# Altium footprint library ref-packages.PCBLIB: 1543 footprints (part 74 of 103) (continued)
## SQFP-R-28X40-432 [mm] (continued)
  rect 1.6x0.17 smd: 129(20.6,-13.05) 130(20.6,-12.75) 131(20.6,-12.45) 132(20.6,-12.15) 133(20.6,-11.85) 134(20.6,-11.55) 135(20.6,-11.25) 136(20.6,-10.95) 137(20.6,-10.65) 138(20.6,-10.35) 139(20.6,-10.05) 140(20.6,-9.75) 141(20.6,-9.45) 142(20.6,-9.15) 143(20.6,-8.85) 144(20.6,-8.55) 145(20.6,-8.25) 146(20.6,-7.95) 147(20.6,-7.65) 148(20.6,-7.35) 149(20.6,-7.05) 150(20.6,-6.75) 151(20.6,-6.45) 152(20.6,-6.15) 153(20.6,-5.85) 154(20.6,-5.55) 155(20.6,-5.25) 156(20.6,-4.95) 157(20.6,-4.65) 158(20.6,-4.35) 159(20.6,-4.05) 160(20.6,-3.75) 161(20.6,-3.45) 162(20.6,-3.15) 163(20.6,-2.85) 164(20.6,-2.55) 165(20.6,-2.25) 166(20.6,-1.95) 167(20.6,-1.65) 168(20.6,-1.35) 169(20.6,-1.05) 170(20.6,-0.75) 171(20.6,-0.45) 172(20.6,-0.15) 173(20.6,0.15) 174(20.6,0.45) 175(20.6,0.75) 176(20.6,1.05) 177(20.6,1.35) 178(20.6,1.65) 179(20.6,1.95) 180(20.6,2.25) 181(20.6,2.55) 182(20.6,2.85) 183(20.6,3.15) 184(20.6,3.45) 185(20.6,3.75) 186(20.6,4.05) 187(20.6,4.35) 188(20.6,4.65) 189(20.6,4.95) 190(20.6,5.25) 191(20.6,5.55) 192(20.6,5.85) 193(20.6,6.15) 194(20.6,6.45) 195(20.6,6.75) 196(20.6,7.05) 197(20.6,7.35) 198(20.6,7.65) 199(20.6,7.95) 200(20.6,8.25) 201(20.6,8.55) 202(20.6,8.85) 203(20.6,9.15) 204(20.6,9.45) 205(20.6,9.75) 206(20.6,10.05) 207(20.6,10.35) 208(20.6,10.65) 209(20.6,10.95) 210(20.6,11.25) 211(20.6,11.55) 212(20.6,11.85) 213(20.6,12.15) 214(20.6,12.45) 215(20.6,12.75) 216(20.6,13.05) 345(-20.6,13.05) 346(-20.6,12.75) 347(-20.6,12.45) 348(-20.6,12.15) 349(-20.6,11.85) 350(-20.6,11.55) 351(-20.6,11.25) 352(-20.6,10.95) 353(-20.6,10.65) 354(-20.6,10.35) 355(-20.6,10.05) 356(-20.6,9.75) 357(-20.6,9.45) 358(-20.6,9.15) 359(-20.6,8.85) 360(-20.6,8.55) 361(-20.6,8.25) 362(-20.6,7.95) 363(-20.6,7.65) 364(-20.6,7.35) 365(-20.6,7.05) 366(-20.6,6.75) 367(-20.6,6.45) 368(-20.6,6.15) 369(-20.6,5.85) 370(-20.6,5.55) 371(-20.6,5.25) 372(-20.6,4.95) 373(-20.6,4.65) 374(-20.6,4.35) 375(-20.6,4.05) 376(-20.6,3.75) 377(-20.6,3.45) 378(-20.6,3.15) 379(-20.6,2.85) 380(-20.6,2.55) 381(-20.6,2.25) 382(-20.6,1.95) 383(-20.6,1.65) 384(-20.6,1.35) 385(-20.6,1.05) 386(-20.6,0.75) 387(-20.6,0.45) 388(-20.6,0.15) 389(-20.6,-0.15) 390(-20.6,-0.45) 391(-20.6,-0.75) 392(-20.6,-1.05) 393(-20.6,-1.35) 394(-20.6,-1.65) 395(-20.6,-1.95) 396(-20.6,-2.25) 397(-20.6,-2.55) 398(-20.6,-2.85) 399(-20.6,-3.15) 400(-20.6,-3.45) 401(-20.6,-3.75) 402(-20.6,-4.05) 403(-20.6,-4.35) 404(-20.6,-4.65) 405(-20.6,-4.95) 406(-20.6,-5.25) 407(-20.6,-5.55) 408(-20.6,-5.85) 409(-20.6,-6.15) 410(-20.6,-6.45) 411(-20.6,-6.75) 412(-20.6,-7.05) 413(-20.6,-7.35) 414(-20.6,-7.65) 415(-20.6,-7.95) 416(-20.6,-8.25) 417(-20.6,-8.55) 418(-20.6,-8.85) 419(-20.6,-9.15) 420(-20.6,-9.45) 421(-20.6,-9.75) 422(-20.6,-10.05) 423(-20.6,-10.35) 424(-20.6,-10.65) 425(-20.6,-10.95) 426(-20.6,-11.25) 427(-20.6,-11.55) 428(-20.6,-11.85) 429(-20.6,-12.15) 430(-20.6,-12.45) 431(-20.6,-12.75) 432(-20.6,-13.05)
Top Overlay:
  circle w0.254: c-17.75,-12 r0.75
  lines w0.203: -19.57,-13.56 19.56,-13.56 19.56,13.56 -19.57,13.56 -19.57,-13.56
Mechanical 16:
  drawing of 436 lines, arcs and shapes, not listed
Mechanical 27:
  lines w0.2: -21.9,-16.4 -21.9,16.4 21.9,16.4 21.9,-16.4 -21.9,-16.4

## SQFP-R-28X40-440 [mm]
pads (440):
  rect 0.17x1.6 smd: 1(-19.35,-14.6) 2(-19.05,-14.6) 3(-18.75,-14.6) 4(-18.45,-14.6) 5(-18.15,-14.6) 6(-17.85,-14.6) 7(-17.55,-14.6) 8(-17.25,-14.6) 9(-16.95,-14.6) 10(-16.65,-14.6) 11(-16.35,-14.6) 12(-16.05,-14.6) 13(-15.75,-14.6) 14(-15.45,-14.6) 15(-15.15,-14.6) 16(-14.85,-14.6) 17(-14.55,-14.6) 18(-14.25,-14.6) 19(-13.95,-14.6) 20(-13.65,-14.6) 21(-13.35,-14.6) 22(-13.05,-14.6) 23(-12.75,-14.6) 24(-12.45,-14.6) 25(-12.15,-14.6) 26(-11.85,-14.6) 27(-11.55,-14.6) 28(-11.25,-14.6) 29(-10.95,-14.6) 30(-10.65,-14.6) 31(-10.35,-14.6) 32(-10.05,-14.6) 33(-9.75,-14.6) 34(-9.45,-14.6) 35(-9.15,-14.6) 36(-8.85,-14.6) 37(-8.55,-14.6) 38(-8.25,-14.6) 39(-7.95,-14.6) 40(-7.65,-14.6) 41(-7.35,-14.6) 42(-7.05,-14.6) 43(-6.75,-14.6) 44(-6.45,-14.6) 45(-6.15,-14.6) 46(-5.85,-14.6) 47(-5.55,-14.6) 48(-5.25,-14.6) 49(-4.95,-14.6) 50(-4.65,-14.6) 51(-4.35,-14.6) 52(-4.05,-14.6) 53(-3.75,-14.6) 54(-3.45,-14.6) 55(-3.15,-14.6) 56(-2.85,-14.6) 57(-2.55,-14.6) 58(-2.25,-14.6) 59(-1.95,-14.6) 60(-1.65,-14.6) 61(-1.35,-14.6) 62(-1.05,-14.6) 63(-0.75,-14.6) 64(-0.45,-14.6) 65(-0.15,-14.6) 66(0.15,-14.6) 67(0.45,-14.6) 68(0.75,-14.6) 69(1.05,-14.6) 70(1.35,-14.6) 71(1.65,-14.6) 72(1.95,-14.6) 73(2.25,-14.6) 74(2.55,-14.6) 75(2.85,-14.6) 76(3.15,-14.6) 77(3.45,-14.6) 78(3.75,-14.6) 79(4.05,-14.6) 80(4.35,-14.6) 81(4.65,-14.6) 82(4.95,-14.6) 83(5.25,-14.6) 84(5.55,-14.6) 85(5.85,-14.6) 86(6.15,-14.6) 87(6.45,-14.6) 88(6.75,-14.6) 89(7.05,-14.6) 90(7.35,-14.6) 91(7.65,-14.6) 92(7.95,-14.6) 93(8.25,-14.6) 94(8.55,-14.6) 95(8.85,-14.6) 96(9.15,-14.6) 97(9.45,-14.6) 98(9.75,-14.6) 99(10.05,-14.6) 100(10.35,-14.6) 101(10.65,-14.6) 102(10.95,-14.6) 103(11.25,-14.6) 104(11.55,-14.6) 105(11.85,-14.6) 106(12.15,-14.6) 107(12.45,-14.6) 108(12.75,-14.6) 109(13.05,-14.6) 110(13.35,-14.6) 111(13.65,-14.6) 112(13.95,-14.6) 113(14.25,-14.6) 114(14.55,-14.6) 115(14.85,-14.6) 116(15.15,-14.6) 117(15.45,-14.6) 118(15.75,-14.6) 119(16.05,-14.6) 120(16.35,-14.6) 121(16.65,-14.6) 122(16.95,-14.6) 123(17.25,-14.6) 124(17.55,-14.6) 125(17.85,-14.6) 126(18.15,-14.6) 127(18.45,-14.6) 128(18.75,-14.6) 129(19.05,-14.6) 130(19.35,-14.6) 221(19.35,14.6) 222(19.05,14.6) 223(18.75,14.6) 224(18.45,14.6) 225(18.15,14.6) 226(17.85,14.6) 227(17.55,14.6) 228(17.25,14.6) 229(16.95,14.6) 230(16.65,14.6) 231(16.35,14.6) 232(16.05,14.6) 233(15.75,14.6) 234(15.45,14.6) 235(15.15,14.6) 236(14.85,14.6) 237(14.55,14.6) 238(14.25,14.6) 239(13.95,14.6) 240(13.65,14.6) 241(13.35,14.6) 242(13.05,14.6) 243(12.75,14.6) 244(12.45,14.6) 245(12.15,14.6) 246(11.85,14.6) 247(11.55,14.6) 248(11.25,14.6) 249(10.95,14.6) 250(10.65,14.6) 251(10.35,14.6) 252(10.05,14.6) 253(9.75,14.6) 254(9.45,14.6) 255(9.15,14.6) 256(8.85,14.6) 257(8.55,14.6) 258(8.25,14.6) 259(7.95,14.6) 260(7.65,14.6) 261(7.35,14.6) 262(7.05,14.6) 263(6.75,14.6) 264(6.45,14.6) 265(6.15,14.6) 266(5.85,14.6) 267(5.55,14.6) 268(5.25,14.6) 269(4.95,14.6) 270(4.65,14.6) 271(4.35,14.6) 272(4.05,14.6) 273(3.75,14.6) 274(3.45,14.6) 275(3.15,14.6) 276(2.85,14.6) 277(2.55,14.6) 278(2.25,14.6) 279(1.95,14.6) 280(1.65,14.6) 281(1.35,14.6) 282(1.05,14.6) 283(0.75,14.6) 284(0.45,14.6) 285(0.15,14.6) 286(-0.15,14.6) 287(-0.45,14.6) 288(-0.75,14.6) 289(-1.05,14.6) 290(-1.35,14.6) 291(-1.65,14.6) 292(-1.95,14.6) 293(-2.25,14.6) 294(-2.55,14.6) 295(-2.85,14.6) 296(-3.15,14.6) 297(-3.45,14.6) 298(-3.75,14.6) 299(-4.05,14.6) 300(-4.35,14.6) 301(-4.65,14.6) 302(-4.95,14.6) 303(-5.25,14.6) 304(-5.55,14.6) 305(-5.85,14.6) 306(-6.15,14.6) 307(-6.45,14.6) 308(-6.75,14.6) 309(-7.05,14.6) 310(-7.35,14.6) 311(-7.65,14.6) 312(-7.95,14.6) 313(-8.25,14.6) 314(-8.55,14.6) 315(-8.85,14.6) 316(-9.15,14.6) 317(-9.45,14.6) 318(-9.75,14.6) 319(-10.05,14.6) 320(-10.35,14.6) 321(-10.65,14.6) 322(-10.95,14.6) 323(-11.25,14.6) 324(-11.55,14.6) 325(-11.85,14.6) 326(-12.15,14.6) 327(-12.45,14.6) 328(-12.75,14.6) 329(-13.05,14.6) 330(-13.35,14.6) 331(-13.65,14.6) 332(-13.95,14.6) 333(-14.25,14.6) 334(-14.55,14.6) 335(-14.85,14.6) 336(-15.15,14.6) 337(-15.45,14.6) 338(-15.75,14.6) 339(-16.05,14.6) 340(-16.35,14.6) 341(-16.65,14.6) 342(-16.95,14.6) 343(-17.25,14.6) 344(-17.55,14.6) 345(-17.85,14.6) 346(-18.15,14.6) 347(-18.45,14.6) 348(-18.75,14.6) 349(-19.05,14.6) 350(-19.35,14.6)
  rect 1.6x0.17 smd: 131(20.6,-13.35) 132(20.6,-13.05) 133(20.6,-12.75) 134(20.6,-12.45) 135(20.6,-12.15) 136(20.6,-11.85) 137(20.6,-11.55) 138(20.6,-11.25) 139(20.6,-10.95) 140(20.6,-10.65) 141(20.6,-10.35) 142(20.6,-10.05) 143(20.6,-9.75) 144(20.6,-9.45) 145(20.6,-9.15) 146(20.6,-8.85) 147(20.6,-8.55) 148(20.6,-8.25) 149(20.6,-7.95) 150(20.6,-7.65) 151(20.6,-7.35) 152(20.6,-7.05) 153(20.6,-6.75) 154(20.6,-6.45) 155(20.6,-6.15) 156(20.6,-5.85) 157(20.6,-5.55) 158(20.6,-5.25) 159(20.6,-4.95) 160(20.6,-4.65) 161(20.6,-4.35) 162(20.6,-4.05) 163(20.6,-3.75) 164(20.6,-3.45) 165(20.6,-3.15) 166(20.6,-2.85) 167(20.6,-2.55) 168(20.6,-2.25) 169(20.6,-1.95) 170(20.6,-1.65) 171(20.6,-1.35) 172(20.6,-1.05) 173(20.6,-0.75) 174(20.6,-0.45) 175(20.6,-0.15) 176(20.6,0.15) 177(20.6,0.45) 178(20.6,0.75) 179(20.6,1.05) 180(20.6,1.35) 181(20.6,1.65) 182(20.6,1.95) 183(20.6,2.25) 184(20.6,2.55) 185(20.6,2.85) 186(20.6,3.15) 187(20.6,3.45) 188(20.6,3.75) 189(20.6,4.05) 190(20.6,4.35) 191(20.6,4.65) 192(20.6,4.95) 193(20.6,5.25) 194(20.6,5.55) 195(20.6,5.85) 196(20.6,6.15) 197(20.6,6.45) 198(20.6,6.75) 199(20.6,7.05) 200(20.6,7.35) 201(20.6,7.65) 202(20.6,7.95) 203(20.6,8.25) 204(20.6,8.55) 205(20.6,8.85) 206(20.6,9.15) 207(20.6,9.45) 208(20.6,9.75) 209(20.6,10.05) 210(20.6,10.35) 211(20.6,10.65) 212(20.6,10.95) 213(20.6,11.25) 214(20.6,11.55) 215(20.6,11.85) 216(20.6,12.15) 217(20.6,12.45) 218(20.6,12.75) 219(20.6,13.05) 220(20.6,13.35) 351(-20.6,13.35) 352(-20.6,13.05) 353(-20.6,12.75) 354(-20.6,12.45) 355(-20.6,12.15) 356(-20.6,11.85) 357(-20.6,11.55) 358(-20.6,11.25) 359(-20.6,10.95) 360(-20.6,10.65) 361(-20.6,10.35) 362(-20.6,10.05) 363(-20.6,9.75) 364(-20.6,9.45) 365(-20.6,9.15) 366(-20.6,8.85) 367(-20.6,8.55) 368(-20.6,8.25) 369(-20.6,7.95) 370(-20.6,7.65) 371(-20.6,7.35) 372(-20.6,7.05) 373(-20.6,6.75) 374(-20.6,6.45) 375(-20.6,6.15) 376(-20.6,5.85) 377(-20.6,5.55) 378(-20.6,5.25) 379(-20.6,4.95) 380(-20.6,4.65) 381(-20.6,4.35) 382(-20.6,4.05) 383(-20.6,3.75) 384(-20.6,3.45) 385(-20.6,3.15) 386(-20.6,2.85) 387(-20.6,2.55) 388(-20.6,2.25) 389(-20.6,1.95) 390(-20.6,1.65) 391(-20.6,1.35) 392(-20.6,1.05) 393(-20.6,0.75) 394(-20.6,0.45) 395(-20.6,0.15) 396(-20.6,-0.15) 397(-20.6,-0.45) 398(-20.6,-0.75) 399(-20.6,-1.05) 400(-20.6,-1.35) 401(-20.6,-1.65) 402(-20.6,-1.95) 403(-20.6,-2.25) 404(-20.6,-2.55) 405(-20.6,-2.85) 406(-20.6,-3.15) 407(-20.6,-3.45) 408(-20.6,-3.75) 409(-20.6,-4.05) 410(-20.6,-4.35) 411(-20.6,-4.65) 412(-20.6,-4.95) 413(-20.6,-5.25) 414(-20.6,-5.55) 415(-20.6,-5.85) 416(-20.6,-6.15) 417(-20.6,-6.45) 418(-20.6,-6.75) 419(-20.6,-7.05) 420(-20.6,-7.35) 421(-20.6,-7.65) 422(-20.6,-7.95) 423(-20.6,-8.25) 424(-20.6,-8.55) 425(-20.6,-8.85) 426(-20.6,-9.15) 427(-20.6,-9.45) 428(-20.6,-9.75) 429(-20.6,-10.05) 430(-20.6,-10.35) 431(-20.6,-10.65) 432(-20.6,-10.95) 433(-20.6,-11.25) 434(-20.6,-11.55) 435(-20.6,-11.85) 436(-20.6,-12.15) 437(-20.6,-12.45) 438(-20.6,-12.75) 439(-20.6,-13.05) 440(-20.6,-13.35)
Top Overlay:
  circle w0.254: c-17.75,-12 r0.75
  lines w0.203: -19.57,-13.56 19.56,-13.56 19.56,13.56 -19.57,13.56 -19.57,-13.56
Mechanical 16:
  drawing of 444 lines, arcs and shapes, not listed
Mechanical 27:
  lines w0.2: -21.9,-16.4 -21.9,16.4 21.9,16.4 21.9,-16.4 -21.9,-16.4

## SQFP-R-FP05X07-32 [mil]
pads (32):
  rect 11.81x62.99 smd: 1(-88.58,-122.05) 2(-68.9,-122.05) 3(-49.21,-122.05) 4(-29.53,-122.05) 5(-9.84,-122.05) 6(9.84,-122.05) 7(29.53,-122.05) 8(49.21,-122.05) 9(68.9,-122.05) 10(88.58,-122.05) 17(88.58,122.05) 18(68.9,122.05) 19(49.21,122.05) 20(29.53,122.05) 21(9.84,122.05) 22(-9.84,122.05) 23(-29.53,122.05) 24(-49.21,122.05) 25(-68.9,122.05) 26(-88.58,122.05)
  rect 62.99x11.81 smd: 11(161.42,-49.21) 12(161.42,-29.53) 13(161.42,-9.84) 14(161.42,9.84) 15(161.42,29.53) 16(161.42,49.21) 27(-161.42,49.21) 28(-161.42,29.53) 29(-161.42,9.84) 30(-161.42,-9.84) 31(-161.42,-29.53) 32(-161.42,-49.21)
Top Overlay:
  circle w10: c-74.8,-39.37 r29.52
  lines w8: -120.87,-81.1 120.47,-81.1 120.47,81.1 -120.87,81.1 -120.87,-81.1
Mechanical 16:
  rectangle: -94.49,-141.73 -82.68,-96.46
  rectangle: 133.86,-55.12 181.1,-43.31
  rectangle: -74.8,-141.73 -62.99,-96.46
  rectangle: -55.12,-141.73 -43.31,-96.46
  rectangle: -35.43,-141.73 -23.62,-96.46
  rectangle: -15.75,-141.73 -3.94,-96.46
  rectangle: 3.94,-141.73 15.75,-96.46
  rectangle: 23.62,-141.73 35.43,-96.46
  rectangle: 43.31,-141.73 55.12,-96.46
  rectangle: 62.99,-141.73 74.8,-96.46
  rectangle: 82.68,-141.73 94.49,-96.46
  rectangle: 133.86,-35.43 181.1,-23.62
  rectangle: 133.86,-15.75 181.1,-3.94
  rectangle: 133.86,3.94 181.1,15.75
  rectangle: 133.86,23.62 181.1,35.43
  rectangle: 133.86,43.31 181.1,55.12
  rectangle: 82.68,96.46 94.49,141.73
  rectangle: 62.99,96.46 74.8,141.73
  rectangle: 43.31,96.46 55.12,141.73
  rectangle: 23.62,96.46 35.43,141.73
  rectangle: 3.94,96.46 15.75,141.73
  rectangle: -15.75,96.46 -3.94,141.73
  rectangle: -35.43,96.46 -23.62,141.73
  rectangle: -55.12,96.46 -43.31,141.73
  rectangle: -74.8,96.46 -62.99,141.73
  rectangle: -94.49,96.46 -82.68,141.73
  rectangle: -181.1,43.31 -133.86,55.12
  rectangle: -181.1,23.62 -133.86,35.43
  rectangle: -181.1,3.94 -133.86,15.75
  rectangle: -181.1,-15.75 -133.86,-3.94
  rectangle: -181.1,-35.43 -133.86,-23.62
  rectangle: -181.1,-55.12 -133.86,-43.31
  lines w8: -133.86,-94.49 133.86,-94.49 133.86,94.49 -133.86,94.49 -133.86,-94.49
Mechanical 27:
  lines w7.87: -212.6,-173.23 -212.6,173.23 212.6,173.23 212.6,-173.23 -212.6,-173.23

## SQFP-S-5X5-24 [mil]
pads (24):
  rect 11.81x62.99 smd: 1(-49.21,-122.05) 2(-29.53,-122.05) 3(-9.84,-122.05) 4(9.84,-122.05) 5(29.53,-122.05) 6(49.21,-122.05) 13(49.21,122.05) 14(29.53,122.05) 15(9.84,122.05) 16(-9.84,122.05) 17(-29.53,122.05) 18(-49.21,122.05)
  rect 62.99x11.81 smd: 7(122.05,-49.21) 8(122.05,-29.53) 9(122.05,-9.84) 10(122.05,9.84) 11(122.05,29.53) 12(122.05,49.21) 19(-122.05,49.21) 20(-122.05,29.53) 21(-122.05,9.84) 22(-122.05,-9.84) 23(-122.05,-29.53) 24(-122.05,-49.21)
Top Overlay:
  circle w10: c-49.21,-49.21 r19.68
  lines w8: -86.61,-86.61 86.61,-86.61 86.61,86.61 -86.61,86.61 -86.61,-86.61
Mechanical 16:
  rectangle: -55.12,-141.73 -43.31,-96.46
  rectangle: -35.43,-141.73 -23.62,-96.46
  rectangle: -15.75,-141.73 -3.94,-96.46
  rectangle: 3.94,-141.73 15.75,-96.46
  rectangle: 23.62,-141.73 35.43,-96.46
  rectangle: 43.31,-141.73 55.12,-96.46
  rectangle: 96.46,-55.12 141.73,-43.31
  rectangle: 96.46,-35.43 141.73,-23.62
  rectangle: 96.46,-15.75 141.73,-3.94
  rectangle: 96.46,3.94 141.73,15.75
  rectangle: 96.46,23.62 141.73,35.43
  rectangle: 96.46,43.31 141.73,55.12
  rectangle: 43.31,96.46 55.12,141.73
  rectangle: 23.62,96.46 35.43,141.73
  rectangle: 3.94,96.46 15.75,141.73
  rectangle: -15.75,96.46 -3.94,141.73
  rectangle: -35.43,96.46 -23.62,141.73
  rectangle: -55.12,96.46 -43.31,141.73
  rectangle: -141.73,43.31 -96.46,55.12
  rectangle: -141.73,23.62 -96.46,35.43
  rectangle: -141.73,3.94 -96.46,15.75
  rectangle: -141.73,-15.75 -96.46,-3.94
  rectangle: -141.73,-35.43 -96.46,-23.62
  rectangle: -141.73,-55.12 -96.46,-43.31
  lines w8: -94.49,-94.49 94.49,-94.49 94.49,94.49 -94.49,94.49 -94.49,-94.49
Mechanical 27:
  lines w7.87: -173.23,-173.23 -173.23,173.23 173.23,173.23 173.23,-173.23 -173.23,-173.23

## SQFP-S-5X5-32 [mil]
pads (32):
  rect 11.81x62.99 smd: 1(-68.9,-122.05) 2(-49.21,-122.05) 3(-29.53,-122.05) 4(-9.84,-122.05) 5(9.84,-122.05) 6(29.53,-122.05) 7(49.21,-122.05) 8(68.9,-122.05) 17(68.9,122.05) 18(49.21,122.05) 19(29.53,122.05) 20(9.84,122.05) 21(-9.84,122.05) 22(-29.53,122.05) 23(-49.21,122.05) 24(-68.9,122.05)
  rect 62.99x11.81 smd: 9(122.05,-68.9) 10(122.05,-49.21) 11(122.05,-29.53) 12(122.05,-9.84) 13(122.05,9.84) 14(122.05,29.53) 15(122.05,49.21) 16(122.05,68.9) 25(-122.05,68.9) 26(-122.05,49.21) 27(-122.05,29.53) 28(-122.05,9.84) 29(-122.05,-9.84) 30(-122.05,-29.53) 31(-122.05,-49.21) 32(-122.05,-68.9)
Top Overlay:
  circle w10: c-49.21,-49.21 r19.68
  lines w8: -86.61,-86.61 86.61,-86.61 86.61,86.61 -86.61,86.61 -86.61,-86.61
Mechanical 16:
  rectangle: -74.8,-141.73 -62.99,-96.46
  rectangle: -55.12,-141.73 -43.31,-96.46
  rectangle: -35.43,-141.73 -23.62,-96.46
  rectangle: -15.75,-141.73 -3.94,-96.46
  rectangle: 3.94,-141.73 15.75,-96.46
  rectangle: 23.62,-141.73 35.43,-96.46
  rectangle: 43.31,-141.73 55.12,-96.46
  rectangle: 62.99,-141.73 74.8,-96.46
  rectangle: 96.46,-74.8 141.73,-62.99
  rectangle: 96.46,-55.12 141.73,-43.31
  rectangle: 96.46,-35.43 141.73,-23.62
  rectangle: 96.46,-15.75 141.73,-3.94
  rectangle: 96.46,3.94 141.73,15.75
  rectangle: 96.46,23.62 141.73,35.43
  rectangle: 96.46,43.31 141.73,55.12
  rectangle: 96.46,62.99 141.73,74.8
  rectangle: 62.99,96.46 74.8,141.73
  rectangle: 43.31,96.46 55.12,141.73
  rectangle: 23.62,96.46 35.43,141.73
  rectangle: 3.94,96.46 15.75,141.73
  rectangle: -15.75,96.46 -3.94,141.73
  rectangle: -35.43,96.46 -23.62,141.73
  rectangle: -55.12,96.46 -43.31,141.73
  rectangle: -74.8,96.46 -62.99,141.73
  rectangle: -141.73,62.99 -96.46,74.8
  rectangle: -141.73,43.31 -96.46,55.12
  rectangle: -141.73,23.62 -96.46,35.43
  rectangle: -141.73,3.94 -96.46,15.75
  rectangle: -141.73,-15.75 -96.46,-3.94
  rectangle: -141.73,-35.43 -96.46,-23.62
  rectangle: -141.73,-55.12 -96.46,-43.31
  rectangle: -141.73,-74.8 -96.46,-62.99
  lines w8: -94.49,-94.49 94.49,-94.49 94.49,94.49 -94.49,94.49 -94.49,-94.49
Mechanical 27:
  lines w7.87: -173.23,-173.23 -173.23,173.23 173.23,173.23 173.23,-173.23 -173.23,-173.23

## SQFP-S-5X5-32-F [mm]
pads (32):
  rect 0.25x1.6 smd: 1(-1.4,-3.1) 2(-1,-3.1) 3(-0.6,-3.1) 4(-0.2,-3.1) 5(0.2,-3.1) 6(0.6,-3.1) 7(1,-3.1) 8(1.4,-3.1) 17(1.4,3.1) 18(1,3.1) 19(0.6,3.1) 20(0.2,3.1) 21(-0.2,3.1) 22(-0.6,3.1) 23(-1,3.1) 24(-1.4,3.1)
  rect 1.6x0.25 smd: 9(3.1,-1.4) 10(3.1,-1) 11(3.1,-0.6) 12(3.1,-0.2) 13(3.1,0.2) 14(3.1,0.6) 15(3.1,1) 16(3.1,1.4) 25(-3.1,1.4) 26(-3.1,1) 27(-3.1,0.6) 28(-3.1,0.2) 29(-3.1,-0.2) 30(-3.1,-0.6) 31(-3.1,-1) 32(-3.1,-1.4)
Top Overlay:
  circle w0.254: c-1.25,-1.25 r0.5
  lines w0.203: -2.2,-2.2 2.2,-2.2 2.2,2.2 -2.2,2.2 -2.2,-2.2
Mechanical 16:
  rectangle: -1.51,-3.6 -1.29,-2.45
  rectangle: -1.11,-3.6 -0.89,-2.45
  rectangle: -0.71,-3.6 -0.49,-2.45
  rectangle: -0.31,-3.6 -0.09,-2.45
  rectangle: 0.09,-3.6 0.31,-2.45
  rectangle: 0.49,-3.6 0.71,-2.45
  rectangle: 0.89,-3.6 1.11,-2.45
  rectangle: 1.29,-3.6 1.51,-2.45
  rectangle: 2.45,-1.51 3.6,-1.29
  rectangle: 2.45,-1.11 3.6,-0.89
  rectangle: 2.45,-0.71 3.6,-0.49
  rectangle: 2.45,-0.31 3.6,-0.09
  rectangle: 2.45,0.09 3.6,0.31
  rectangle: 2.45,0.49 3.6,0.71
  rectangle: 2.45,0.89 3.6,1.11
  rectangle: 2.45,1.29 3.6,1.51
  rectangle: 1.29,2.45 1.51,3.6
  rectangle: 0.89,2.45 1.11,3.6
  rectangle: 0.49,2.45 0.71,3.6
  rectangle: 0.09,2.45 0.31,3.6
  rectangle: -0.31,2.45 -0.09,3.6
  rectangle: -0.71,2.45 -0.49,3.6
  rectangle: -1.11,2.45 -0.89,3.6
  rectangle: -1.51,2.45 -1.29,3.6
  rectangle: -3.6,1.29 -2.45,1.51
  rectangle: -3.6,0.89 -2.45,1.11
  rectangle: -3.6,0.49 -2.45,0.71
  rectangle: -3.6,0.09 -2.45,0.31
  rectangle: -3.6,-0.31 -2.45,-0.09
  rectangle: -3.6,-0.71 -2.45,-0.49
  rectangle: -3.6,-1.11 -2.45,-0.89
  rectangle: -3.6,-1.51 -2.45,-1.29
  lines w0.203: -2.4,-2.4 2.4,-2.4 2.4,2.4 -2.4,2.4 -2.4,-2.4
Mechanical 27:
  lines w0.2: -4.4,-4.4 -4.4,4.4 4.4,4.4 4.4,-4.4 -4.4,-4.4

## SQFP-S-5X5-40 [mm]
pads (40):
  rect 0.25x1.6 smd: 1(-1.8,-3.1) 2(-1.4,-3.1) 3(-1,-3.1) 4(-0.6,-3.1) 5(-0.2,-3.1) 6(0.2,-3.1) 7(0.6,-3.1) 8(1,-3.1) 9(1.4,-3.1) 10(1.8,-3.1) 21(1.8,3.1) 22(1.4,3.1) 23(1,3.1) 24(0.6,3.1) 25(0.2,3.1) 26(-0.2,3.1) 27(-0.6,3.1) 28(-1,3.1) 29(-1.4,3.1) 30(-1.8,3.1)
  rect 1.6x0.25 smd: 11(3.1,-1.8) 12(3.1,-1.4) 13(3.1,-1) 14(3.1,-0.6) 15(3.1,-0.2) 16(3.1,0.2) 17(3.1,0.6) 18(3.1,1) 19(3.1,1.4) 20(3.1,1.8) 31(-3.1,1.8) 32(-3.1,1.4) 33(-3.1,1) 34(-3.1,0.6) 35(-3.1,0.2) 36(-3.1,-0.2) 37(-3.1,-0.6) 38(-3.1,-1) 39(-3.1,-1.4) 40(-3.1,-1.8)
Top Overlay:
  circle w0.254: c-1.25,-1.25 r0.5
  lines w0.203: -2.2,-2.2 2.2,-2.2 2.2,2.2 -2.2,2.2 -2.2,-2.2
Mechanical 16:
  rectangle: -1.91,-3.6 -1.69,-2.45
  rectangle: -1.51,-3.6 -1.29,-2.45
  rectangle: -1.11,-3.6 -0.89,-2.45
  rectangle: -0.71,-3.6 -0.49,-2.45
  rectangle: -0.31,-3.6 -0.09,-2.45
  rectangle: 0.09,-3.6 0.31,-2.45
  rectangle: 0.49,-3.6 0.71,-2.45
  rectangle: 0.89,-3.6 1.11,-2.45
  rectangle: 1.29,-3.6 1.51,-2.45
  rectangle: 1.69,-3.6 1.91,-2.45
  rectangle: 2.45,-1.91 3.6,-1.69
  rectangle: 2.45,-1.51 3.6,-1.29
  rectangle: 2.45,-1.11 3.6,-0.89
  rectangle: 2.45,-0.71 3.6,-0.49
  rectangle: 2.45,-0.31 3.6,-0.09
  rectangle: 2.45,0.09 3.6,0.31
  rectangle: 2.45,0.49 3.6,0.71
  rectangle: 2.45,0.89 3.6,1.11
  rectangle: 2.45,1.29 3.6,1.51
  rectangle: 2.45,1.69 3.6,1.91
  rectangle: 1.69,2.45 1.91,3.6
  rectangle: 1.29,2.45 1.51,3.6
  rectangle: 0.89,2.45 1.11,3.6
  rectangle: 0.49,2.45 0.71,3.6
  rectangle: 0.09,2.45 0.31,3.6
  rectangle: -0.31,2.45 -0.09,3.6
  rectangle: -0.71,2.45 -0.49,3.6
  rectangle: -1.11,2.45 -0.89,3.6
  rectangle: -1.51,2.45 -1.29,3.6
  rectangle: -1.91,2.45 -1.69,3.6
  rectangle: -3.6,1.69 -2.45,1.91
  rectangle: -3.6,1.29 -2.45,1.51
  rectangle: -3.6,0.89 -2.45,1.11
  rectangle: -3.6,0.49 -2.45,0.71
  rectangle: -3.6,0.09 -2.45,0.31
  rectangle: -3.6,-0.31 -2.45,-0.09
  rectangle: -3.6,-0.71 -2.45,-0.49
  rectangle: -3.6,-1.11 -2.45,-0.89
  rectangle: -3.6,-1.51 -2.45,-1.29
  rectangle: -3.6,-1.91 -2.45,-1.69
  lines w0.203: -2.4,-2.4 2.4,-2.4 2.4,2.4 -2.4,2.4 -2.4,-2.4
Mechanical 27:
  lines w0.2: -4.4,-4.4 -4.4,4.4 4.4,4.4 4.4,-4.4 -4.4,-4.4

## SQFP-S-5X5-48 [mm]
pads (48):
  rect 0.17x1.6 smd: 1(-1.65,-3.1) 2(-1.35,-3.1) 3(-1.05,-3.1) 4(-0.75,-3.1) 5(-0.45,-3.1) 6(-0.15,-3.1) 7(0.15,-3.1) 8(0.45,-3.1) 9(0.75,-3.1) 10(1.05,-3.1) 11(1.35,-3.1) 12(1.65,-3.1) 25(1.65,3.1) 26(1.35,3.1) 27(1.05,3.1) 28(0.75,3.1) 29(0.45,3.1) 30(0.15,3.1) 31(-0.15,3.1) 32(-0.45,3.1) 33(-0.75,3.1) 34(-1.05,3.1) 35(-1.35,3.1) 36(-1.65,3.1)
  rect 1.6x0.17 smd: 13(3.1,-1.65) 14(3.1,-1.35) 15(3.1,-1.05) 16(3.1,-0.75) 17(3.1,-0.45) 18(3.1,-0.15) 19(3.1,0.15) 20(3.1,0.45) 21(3.1,0.75) 22(3.1,1.05) 23(3.1,1.35) 24(3.1,1.65) 37(-3.1,1.65) 38(-3.1,1.35) 39(-3.1,1.05) 40(-3.1,0.75) 41(-3.1,0.45) 42(-3.1,0.15) 43(-3.1,-0.15) 44(-3.1,-0.45) 45(-3.1,-0.75) 46(-3.1,-1.05) 47(-3.1,-1.35) 48(-3.1,-1.65)
Top Overlay:
  circle w0.254: c-1.25,-1.25 r0.5
  lines w0.203: -2.2,-2.2 2.2,-2.2 2.2,2.2 -2.2,2.2 -2.2,-2.2
Mechanical 16:
  rectangle: -1.72,-3.6 -1.58,-2.45
  rectangle: -1.42,-3.6 -1.28,-2.45
  rectangle: -1.12,-3.6 -0.98,-2.45
  rectangle: -0.82,-3.6 -0.68,-2.45
  rectangle: -0.52,-3.6 -0.38,-2.45
  rectangle: -0.22,-3.6 -0.08,-2.45
  rectangle: 0.08,-3.6 0.22,-2.45
  rectangle: 0.38,-3.6 0.52,-2.45
  rectangle: 0.68,-3.6 0.82,-2.45
  rectangle: 0.98,-3.6 1.12,-2.45
  rectangle: 1.28,-3.6 1.42,-2.45
  rectangle: 1.58,-3.6 1.72,-2.45
  rectangle: 2.45,-1.72 3.6,-1.58
  rectangle: 2.45,-1.42 3.6,-1.28
  rectangle: 2.45,-1.12 3.6,-0.98
  rectangle: 2.45,-0.82 3.6,-0.68
  rectangle: 2.45,-0.52 3.6,-0.38
  rectangle: 2.45,-0.22 3.6,-0.08
  rectangle: 2.45,0.08 3.6,0.22
  rectangle: 2.45,0.38 3.6,0.52
  rectangle: 2.45,0.68 3.6,0.82
  rectangle: 2.45,0.98 3.6,1.12
  rectangle: 2.45,1.28 3.6,1.42
  rectangle: 2.45,1.58 3.6,1.72
  rectangle: 1.58,2.45 1.72,3.6
  rectangle: 1.28,2.45 1.42,3.6
  rectangle: 0.98,2.45 1.12,3.6
  rectangle: 0.68,2.45 0.82,3.6
  rectangle: 0.38,2.45 0.52,3.6
  rectangle: 0.08,2.45 0.22,3.6
  rectangle: -0.22,2.45 -0.08,3.6
  rectangle: -0.52,2.45 -0.38,3.6
  rectangle: -0.82,2.45 -0.68,3.6
  rectangle: -1.12,2.45 -0.98,3.6
  rectangle: -1.42,2.45 -1.28,3.6
  rectangle: -1.72,2.45 -1.58,3.6
  rectangle: -3.6,1.58 -2.45,1.72
  rectangle: -3.6,1.28 -2.45,1.42
  rectangle: -3.6,0.98 -2.45,1.12
  rectangle: -3.6,0.68 -2.45,0.82
  rectangle: -3.6,0.38 -2.45,0.52
  rectangle: -3.6,0.08 -2.45,0.22
  rectangle: -3.6,-0.22 -2.45,-0.08
  rectangle: -3.6,-0.52 -2.45,-0.38
  rectangle: -3.6,-0.82 -2.45,-0.68
  rectangle: -3.6,-1.12 -2.45,-0.98
  rectangle: -3.6,-1.42 -2.45,-1.28
  rectangle: -3.6,-1.72 -2.45,-1.58
  lines w0.203: -2.4,-2.4 2.4,-2.4 2.4,2.4 -2.4,2.4 -2.4,-2.4
Mechanical 27:
  lines w0.2: -4.4,-4.4 -4.4,4.4 4.4,4.4 4.4,-4.4 -4.4,-4.4